# Altium footprint library Custom1.PcbLib: 554 footprints (part 13 of 35)
Each footprint in its own frame and in the unit in brackets; x right, y up, seen from the top. Pads: shape width x height; smd on the part's side, far side on the other; paste and mask are expansions set on the pad; w line width, h text height; cw(c..) or ccw(c..) is an arc to the next point about the centre after c.
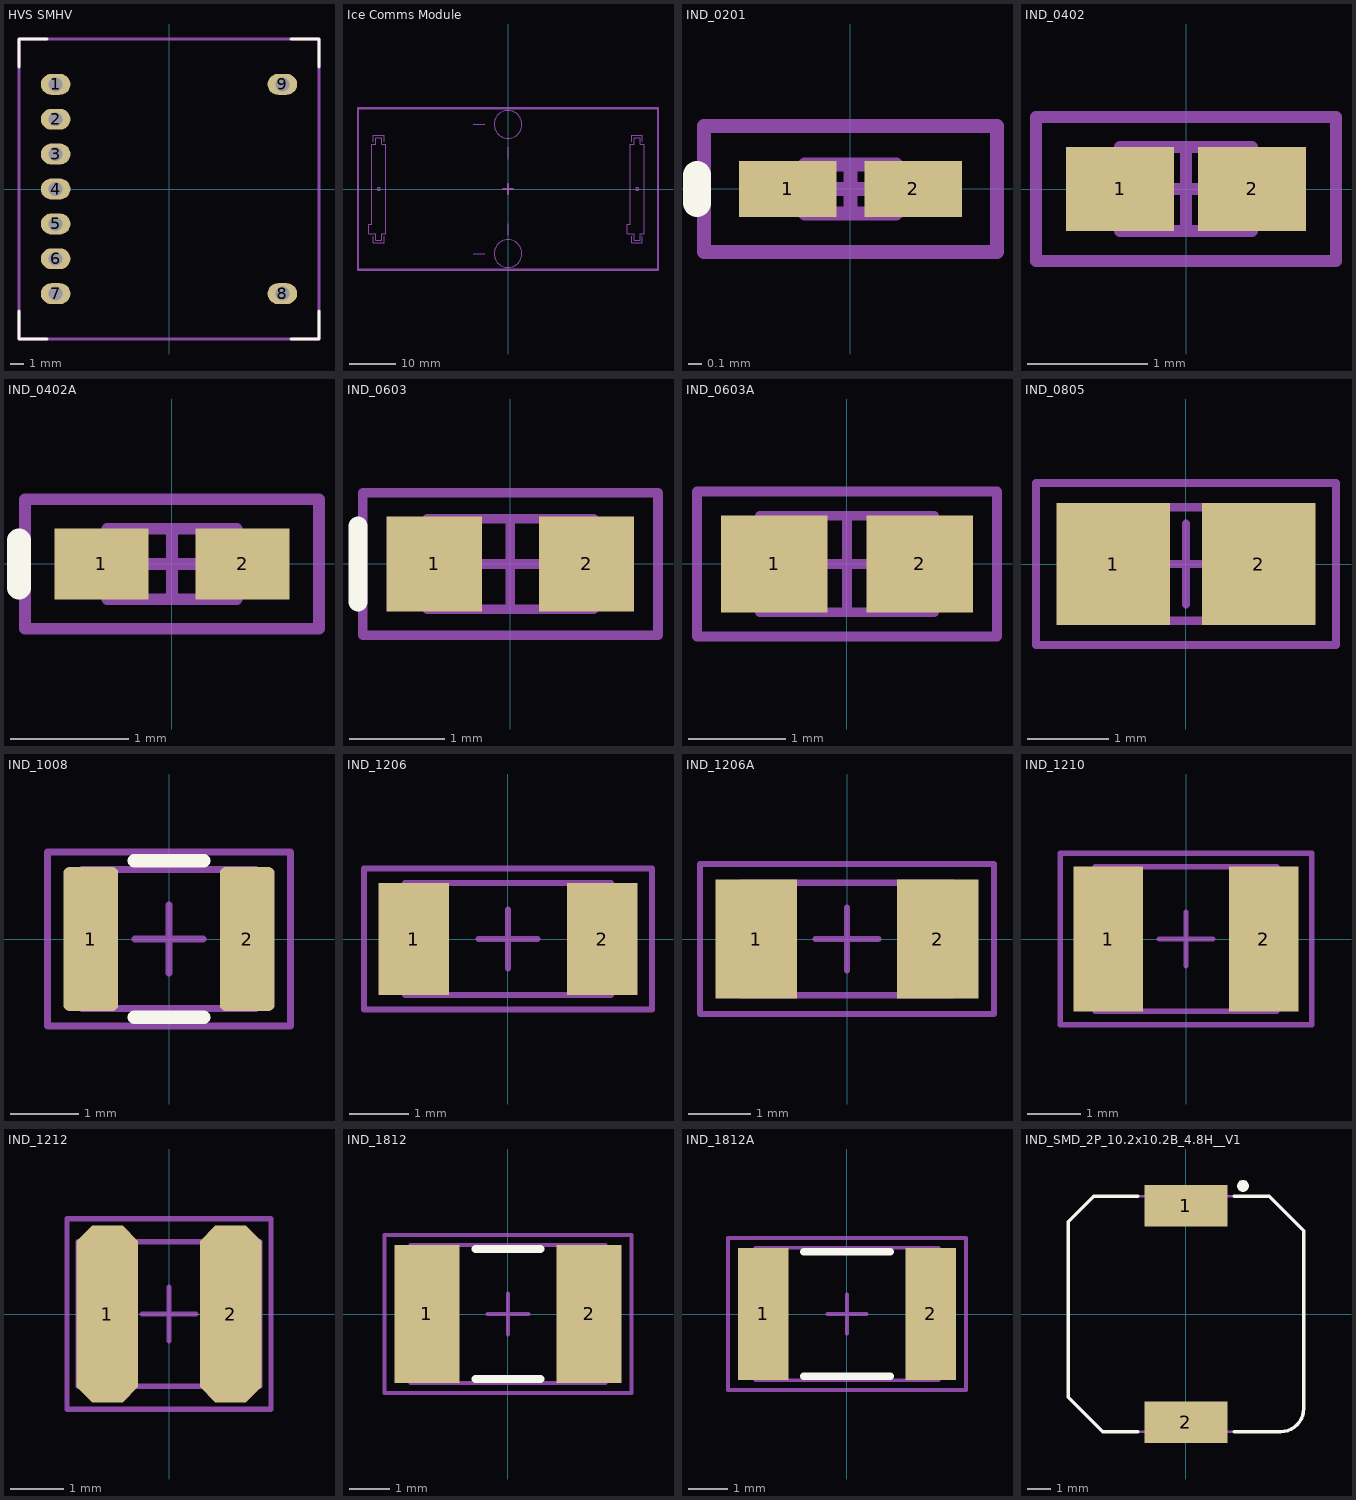
[diagram p12: the footprints below, top view; thin cyan lines are the x and y axes]

## HVS SMHV [mil] "Programmable Regulated HV Supply Module"
pads (9):
  oval 85x60 hole 40: 1(-325,300) 2(-325,200) 3(-325,100) 4(-325,0) 5(-325,-100) 6(-325,-200) 7(-325,-300) 8(325,-300) 9(325,300)
Top Overlay:
  lines w10: -430,-350 -430,-430 -350,-430 ; -430,350 -430,430 -350,430 ; 350,-430 430,-430 430,-350 ; 350,430 430,430 430,350
Mechanical 15:
  lines w10: -430,-430 -430,430 430,430 430,-430 -430,-430
3D body: height 600, standoff 20, extent -420,-420 420,420

## Ice Comms Module [mm] "Ice Comms Module"
Mechanical 13:
  circle w0.254: c-27.998,-0.001 r0.316
  circle w0.254: c28.002,-0.001 r0.316
  circle w0.254: c0,14 r3
  circle w0.254: c0,-14 r3
  lines w0.254: -29.148,-10.212 -29.148,-11.609 -26.862,-11.609 -26.862,-10.212 ; -29.148,10.235 -29.148,11.632 -26.862,11.632 -26.862,10.235 ; -7.5,-14 -5,-14 ; -7.5,14 -5,14 ; 0,-10 0,-7.5 ; 0,6.5 0,9 ; 26.852,-10.212 26.852,-11.609 29.138,-11.609 29.138,-10.212 ; 26.852,10.235 26.852,11.632 29.138,11.632 29.138,10.235 ; -30.165,-9.703 -28.641,-9.703 -28.641,-11.1 -27.371,-11.1 -27.371,-9.703 -26.482,-9.703 -26.482,9.728 -27.371,9.728 -27.371,11.125 -28.641,11.125 -28.641,9.728 -29.53,9.728 -29.53,-7.671 -30.165,-7.671 -30.165,-9.703 ; 25.835,-9.703 27.359,-9.703 27.359,-11.1 28.629,-11.1 28.629,-9.703 29.518,-9.703 29.518,9.728 28.629,9.728 28.629,11.125 27.359,11.125 27.359,9.728 26.47,9.728 26.47,-7.671 25.835,-7.671 25.835,-9.703
  lines w0.5: -1,0 1,0 ; 0,-1 0,1 ; -32.5,-17.5 -32.5,17.5 -32.5,17.5 ; -32.5,-17.5 32.5,-17.5 ; -32.5,-17.5 -32.5,17.5 ; -32.5,-17.5 32.5,-17.5 ; -32.5,17.5 32.5,17.5 ; -32.5,17.5 32.5,17.5 ; 32.5,-17.5 32.5,17.5 ; 32.5,-17.5 32.5,17.5
  text "Keystone 4883" at 5,-13.5 h1.52
  text "Keystone 4883" at 4,14.5 h1.52
  text "SFM-115-X2-XXX-D-A" at 20.5,-6 h1.52
  text "SFM-115-X2-XXX-D-A" at -22.75,-6.75 h1.52
  text "ICM-MH2" at 5,-16 h1.52
  text "ICM-MH1" at 4,12 h1.52
  text "ICM-J2" at 23,-3.5 h1.52
  text "ICM-J1" at -20.25,-3.5 h1.52
  text "1" at -24.25,10.25 h1.52
  text "1" at 31.75,10.25 h1.52
3D body "Ice Comms Module.step": height 14.37, standoff 0.47, extent -32.5,-17.5 32.5,19.203

## IND_0201 [mm] "Chip Inductor, Body 0.6x0.3mm, IPC Medium Density"
height 0.35
pads (2):
  rect 0.7x0.4 smd: 1(-0.45,0) 2(0.45,0)
Top Overlay:
  lines w0.2: -1.1,-0.1 -1.1,0.1
Mechanical 13:
  lines w0.1: -0.325,-0.175 -0.325,0.175 0.325,0.175 0.325,-0.175 -0.325,-0.175
Mechanical 15:
  lines w0.1: -0.175,0 0.175,0 ; 0,-0.175 0,0.175 ; -1.05,-0.45 -1.05,0.45 1.05,0.45 1.05,-0.45 -1.05,-0.45
3D body: height 0.35, standoff 0, extent -0.325,-0.175 0.325,0.175

## IND_0402 [mm] "Chip Inductor, Body 1.0x0.5mm, IPC Medium Density"
height 0.6
pads (2):
  rect 0.9x0.7 smd: 1(-0.55,0) 2(0.55,0)
Mechanical 13:
  lines w0.1: -0.55,-0.35 0.55,-0.35 0.55,0.35 -0.55,0.35 -0.55,-0.35
Mechanical 15:
  lines w0.1: -0.35,0 0.35,0 ; 0,-0.35 0,0.35 ; -1.25,-0.6 1.25,-0.6 1.25,0.6 -1.25,0.6 -1.25,-0.6
3D body: height 0.6, standoff 0, extent -0.55,-0.35 0.55,0.35

## IND_0402A [mm] "Chip Inductor, Body 1.0x0.5mm, IPC Medium Density"
height 0.55
pads (2):
  rect 0.8x0.6 smd: 1(-0.6,0) 2(0.6,0)
Top Overlay:
  lines w0.2: -1.3,-0.2 -1.3,0.2
Mechanical 13:
  lines w0.1: -0.55,-0.3 -0.55,0.3 0.55,0.3 0.55,-0.3 -0.55,-0.3
Mechanical 15:
  lines w0.1: -0.3,0 0.3,0 ; 0,-0.3 0,0.3 ; -1.25,-0.55 -1.25,0.55 1.25,0.55 1.25,-0.55 -1.25,-0.55
3D body: height 0.55, standoff 0, extent -0.55,-0.3 0.55,0.3

## IND_0603 [mm] "Chip Inductor, Body 1.6x0.8mm, IPC Medium Density"
height 0.71
pads (2):
  rect 1x1 smd: 1(-0.8,0) 2(0.8,0)
Top Overlay:
  lines w0.2: -1.6,-0.4 -1.6,0.4
Mechanical 13:
  lines w0.1: -0.875,-0.475 0.875,-0.475 0.875,0.475 -0.875,0.475 -0.875,-0.475
Mechanical 15:
  lines w0.1: -0.475,0 0.475,0 ; 0,-0.475 0,0.475 ; -1.55,-0.75 1.55,-0.75 1.55,0.75 -1.55,0.75 -1.55,-0.75
3D body: height 0.71, standoff 0, extent -0.875,-0.475 0.875,0.475

## IND_0603A [mm] "Chip Inductor, Body 1.6x0.8mm, IPC Medium Density"
height 1
pads (2):
  rect 1.1x1 smd: 1(-0.75,0) 2(0.75,0)
Mechanical 13:
  lines w0.1: -0.9,-0.5 -0.9,0.5 0.9,0.5 0.9,-0.5 -0.9,-0.5
Mechanical 15:
  lines w0.1: -0.5,0 0.5,0 ; 0,-0.5 0,0.5 ; -1.55,-0.75 -1.55,0.75 1.55,0.75 1.55,-0.75 -1.55,-0.75
3D body: height 1, standoff 0, extent -0.9,-0.5 0.9,0.5

## IND_0805 [mm] "Chip Inductor, Body 2.0x1.2mm, IPC Medium Density"
height 1.1
pads (2):
  rect 1.4x1.5 smd: 1(-0.9,0) 2(0.9,0)
Mechanical 13:
  lines w0.1: -1.1,-0.7 -1.1,0.7 1.1,0.7 1.1,-0.7 -1.1,-0.7
Mechanical 15:
  lines w0.1: -0.5,0 0.5,0 ; 0,-0.5 0,0.5 ; -1.85,-1 -1.85,1 1.85,1 1.85,-1 -1.85,-1
3D body: height 1.1, standoff 0, extent -1.1,-0.7 1.1,0.7

## IND_1008 [mm] "Chip Inductor, Body 2x2.5mm, custom"
height 1.1
pads (2):
  rrect20% 0.8x2.1 smd: 1(-1.143,0) 2(1.143,0)
Top Overlay:
  lines w0.2: -0.508,-1.143 0.508,-1.143 ; -0.508,1.143 0.508,1.143
Mechanical 13:
  lines w0.1: -1.27,-1.016 1.27,-1.016 1.27,1.016 -1.27,1.016 -1.27,-1.016
Mechanical 15:
  lines w0.1: -0.5,0 0.5,0 ; 0,-0.5 0,0.5 ; -1.778,-1.27 1.778,-1.27 1.778,1.27 -1.778,1.27 -1.778,-1.27
3D body: height 1.35, standoff 0, extent -1.27,-1.016 1.27,1.016

## IND_1206 [mm] "Chip Inductor, Body 3.2x1.6mm, IPC Medium Density"
height 1.9
pads (2):
  rect 1.2x1.9 smd: 1(-1.6,0) 2(1.6,0)
Mechanical 13:
  lines w0.1: -1.75,-0.95 -1.75,0.95 1.75,0.95 1.75,-0.95 -1.75,-0.95
Mechanical 15:
  lines w0.1: -0.5,0 0.5,0 ; 0,-0.5 0,0.5 ; -2.45,-1.2 -2.45,1.2 2.45,1.2 2.45,-1.2 -2.45,-1.2
3D body: height 1.9, standoff 0, extent -1.75,-0.95 1.75,0.95

## IND_1206A [mm] "Chip Inductor, Body 3.2x1.6mm, IPC Medium Density"
height 1.3
pads (2):
  rect 1.3x1.9 smd: 1(-1.45,0) 2(1.45,0)
Mechanical 13:
  lines w0.1: -1.7,-0.9 -1.7,0.9 1.7,0.9 1.7,-0.9 -1.7,-0.9
Mechanical 15:
  lines w0.1: -0.5,0 0.5,0 ; 0,-0.5 0,0.5 ; -2.35,-1.2 -2.35,1.2 2.35,1.2 2.35,-1.2 -2.35,-1.2
3D body: height 1.3, standoff 0, extent -1.7,-0.9 1.7,0.9

## IND_1210 [mm] "Chip Inductor, Body 3.2x2.5mm, IPC Medium Density"
height 1.5
pads (2):
  rect 1.3x2.7 smd: 1(-1.45,0) 2(1.45,0)
Mechanical 13:
  lines w0.1: -1.7,-1.35 -1.7,1.35 1.7,1.35 1.7,-1.35 -1.7,-1.35
Mechanical 15:
  lines w0.1: -0.5,0 0.5,0 ; 0,-0.5 0,0.5 ; -2.35,-1.6 -2.35,1.6 2.35,1.6 2.35,-1.6 -2.35,-1.6
3D body: height 1.5, standoff 0, extent -1.7,-1.35 1.7,1.35

## IND_1212 [mm] "Chip Inductor, Body 3.2x2.5mm, IPC Medium Density"
height 1.5
pads (2):
  oct 1.15x3.3 smd: 1(-1.15,0) 2(1.15,0)
Mechanical 13:
  lines w0.1: -1.7,-1.35 1.7,-1.35 1.7,1.35 -1.7,1.35 -1.7,-1.35
Mechanical 15:
  lines w0.1: -0.5,0 0.5,0 ; 0,-0.5 0,0.5 ; -1.905,-1.778 1.905,-1.778 1.905,1.778 -1.905,1.778 -1.905,-1.778
3D body: height 1.5, standoff 0, extent -1.7,-1.35 1.7,1.35

## IND_1812 [mm] "Chip Inductor, Body 4.5x3.2mm, IPC Medium Density"
height 1.35
pads (2):
  rect 1.6x3.4 smd: 1(-2,0) 2(2,0)
Top Overlay:
  lines w0.2: -0.8,-1.6 0.8,-1.6 ; -0.8,1.6 0.8,1.6
Mechanical 13:
  lines w0.1: -2.4,-1.7 2.4,-1.7 2.4,1.7 -2.4,1.7 -2.4,-1.7
Mechanical 15:
  lines w0.1: -0.5,0 0.5,0 ; 0,-0.5 0,0.5 ; -3.05,-1.95 3.05,-1.95 3.05,1.95 -3.05,1.95 -3.05,-1.95
3D body: height 1.35, standoff 0, extent -2.4,-1.7 2.4,1.7

## IND_1812A [mm] "Chip Inductor, Body 4.5x3.2mm, IPC Medium Density"
height 1.7
pads (2):
  rect 1.3x3.4 smd: 1(-2.15,0) 2(2.15,0)
Top Overlay:
  lines w0.2: -1.1,-1.6 1.1,-1.6 ; -1.1,1.6 1.1,1.6
Mechanical 13:
  lines w0.1: -2.35,-1.7 -2.35,1.7 2.35,1.7 2.35,-1.7 -2.35,-1.7
Mechanical 15:
  lines w0.1: -0.5,0 0.5,0 ; 0,-0.5 0,0.5 ; -3.05,-1.95 -3.05,1.95 3.05,1.95 3.05,-1.95 -3.05,-1.95
3D body: height 1.7, standoff 0, extent -2.35,-1.7 2.35,1.7

## IND_SMD_2P_10.2x10.2B_4.8H__V1 [mm]
pads (2):
  rect 3.6x1.8 smd paste-0.05 mask+0.05: 1(0,4.7) 2(0,-4.7)
Top Overlay:
  region: 2.724,5.55 2.724,5.6 2.685,5.694 2.614,5.765 2.52,5.804 2.47,5.804 2.419,5.804 2.326,5.765 2.254,5.694 2.216,5.6 2.216,5.55 2.216,5.499 2.254,5.406 2.326,5.334 2.419,5.296 2.47,5.296 2.52,5.296 2.614,5.334 2.685,5.406 2.724,5.499
  lines w0.15: -2.1,-5.1 -3.6,-5.1 -5.1,-3.6 -5.1,4 -4,5.1 -2.1,5.1 ; 2.1,-5.1 4.1,-5.1 ccw(c4.1,-4.1) 5.1,-4.1 5.1,3.6 3.6,5.1 2.1,5.1
Mechanical 13:
  lines w0.1: -5.1,-3.6 -5.1,4 -4,5.1 3.6,5.1 5.1,3.6 5.1,-4.1 cw(c4.1,-4.1) 4.1,-5.1 -3.6,-5.1 -5.1,-3.6
3D body: height 4.83, standoff 0.03, extent -5.1,-5.1 5.1,5.1